# Altium footprint library ESKDPcbLib.PcbLib: 608 footprints (part 5 of 38)
Each footprint in its own frame and in the unit in brackets; x right, y up, seen from the top. Pads: shape width x height; smd on the part's side, far side on the other; paste and mask are expansions set on the pad; w line width, h text height; cw(c..) or ccw(c..) is an arc to the next point about the centre after c.
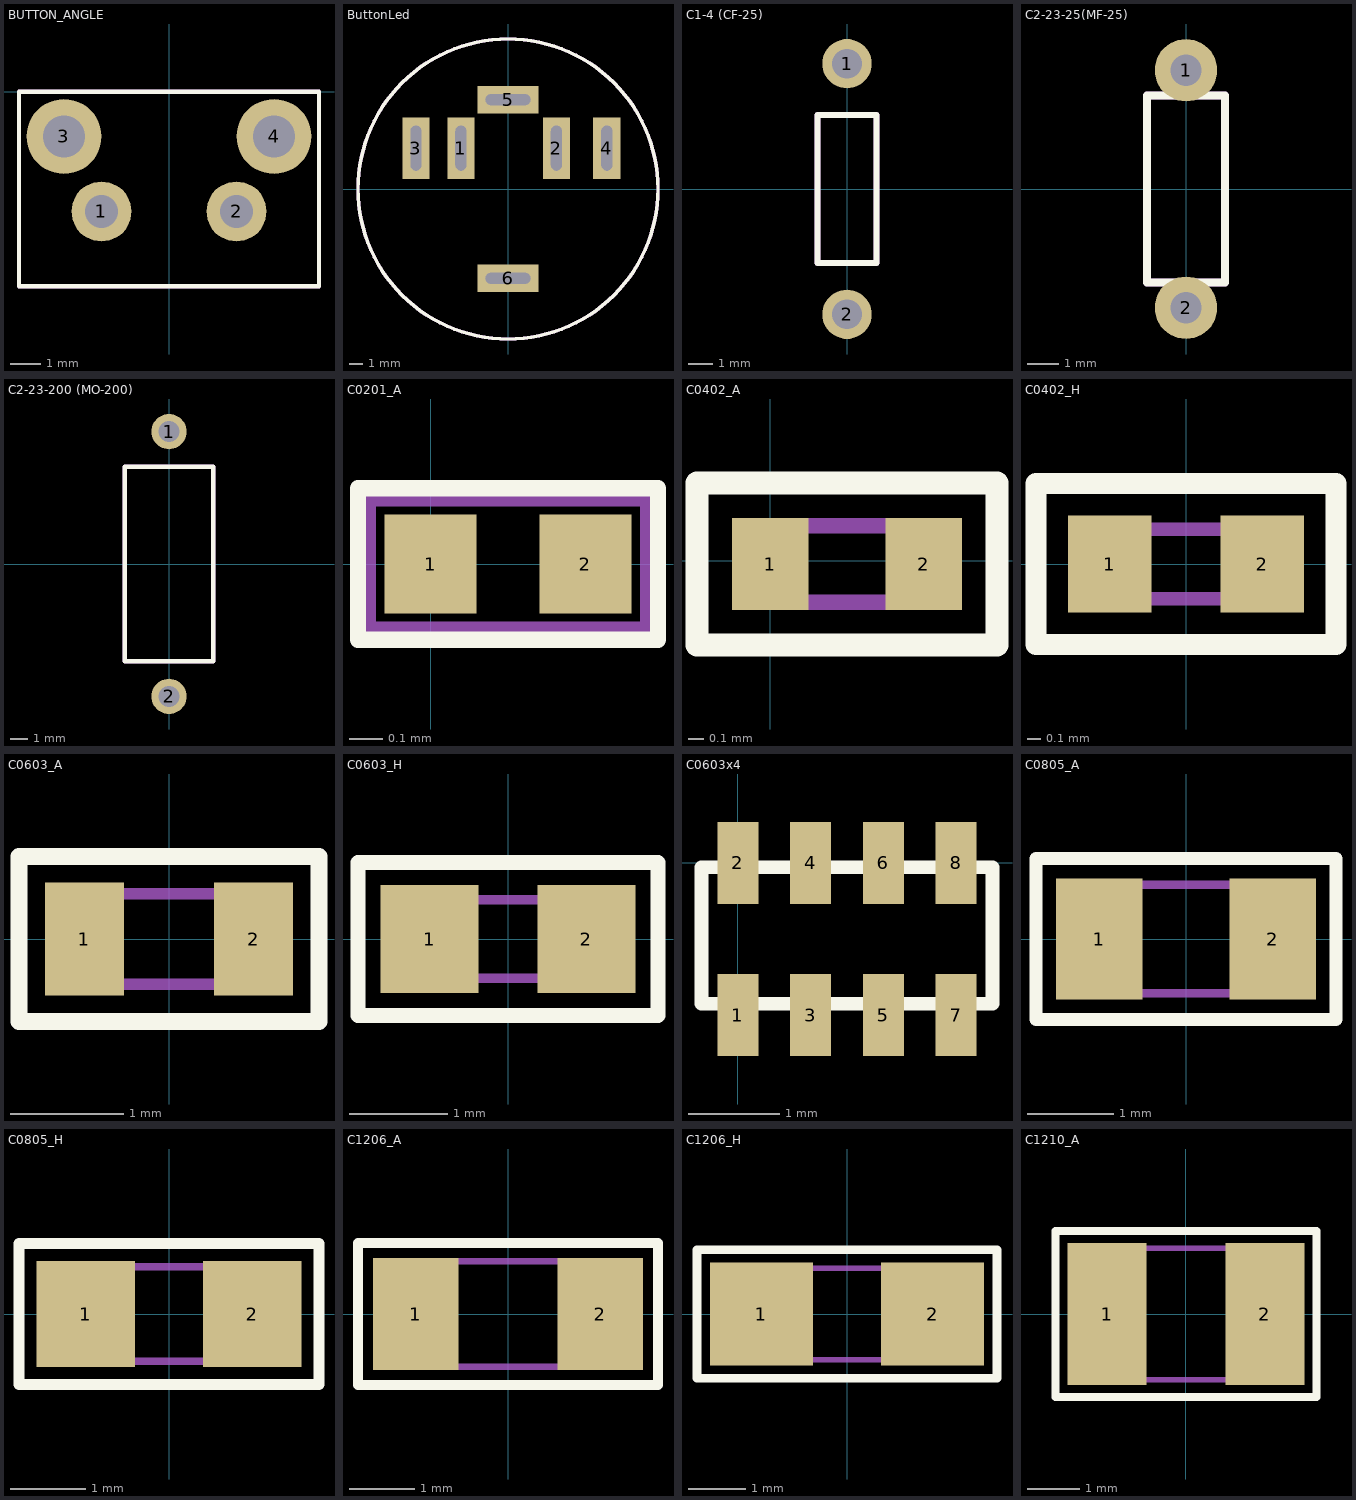
[diagram p4: the footprints below, top view; thin cyan lines are the x and y axes]

## BUTTON_ANGLE [mm]
pads (4):
  round 2 hole 1.1: 1(-2.25,-4) 2(2.25,-4)
  round 2.5 hole 1.4: 3(-3.5,-1.5) 4(3.5,-1.5)
Top Overlay:
  lines w0.15: -5,-6.5 5,-6.5 5,0 -5,0 -5,-6.5
Mechanical 7:
  lines w0.15: -5,-6.5 -5,0 5,0 5,-6.5 -5,-6.5
3D body: height 7.1, standoff -3.5, extent -3.998,-12.35 4,-0.05

## ButtonLed [mm]
pads (6):
  rect 2x4.5 hole 0.8 slot 3.3 at 90 deg: 1(-3.45,3) 2(3.55,3) 3(-6.75,3) 4(7.25,3)
  rect 4.5x2 hole 0.8 slot 3.3 at 0 deg: 5(0,6.55) 6(0,-6.55)
Top Overlay:
  circle w0.254: c0,0 r11
Mechanical 7:
  circle w0.254: c0,0 r11
Mechanical 10:
  text ".Designator" at -1,13.75 h1.52
  text ".Comment" at -1,12 h1.52

## C1-4 (CF-25) [mm]
pads (2):
  round 2 hole 1.2: 1(0,5.08) 2(0,-5.08)
Top Overlay:
  lines w0.254: -1.2,-3 1.2,-3 1.2,3 -1.2,3 -1.2,-3
Mechanical 7:
  lines w0.254: -1.2,-3 1.2,-3 1.2,3 -1.2,3 -1.2,-3
Mechanical 10:
  text ".Designator" at 4.2,3.3 h2
  text ".Comment" at 4.2,1.7 h2
3D body "Res40-Axial Short 0_25W-820K.step": height 2.41, standoff -2, extent -1.2,-5.38 1.2,5.38

## C2-23-25(MF-25) [mm]
pads (2):
  round 2 hole 1: 1(0,3.81) 2(0,-3.81)
Top Overlay:
  lines w0.254: -1.25,-3 1.25,-3 1.25,3 -1.25,3 -1.25,-3
Mechanical 7:
  lines w0.254: -1.25,-3 1.25,-3 1.25,3 -1.25,3 -1.25,-3
Mechanical 10:
  text ".Designator" at 4.2,3.3 h2
  text ".Comment" at 4.2,1.7 h2
3D body "MFR-25 MFR50S (300mils).STEP": height 3.2, standoff -2.08, extent -1.2,-4.085 1.2,4.085

## C2-23-200 (MO-200) [mm]
pads (2):
  round 2 hole 1.2: 1(0,7.5) 2(0,-7.5)
Top Overlay:
  lines w0.254: -2.5,-5.5 -2.5,5.5 2.5,5.5 2.5,-5.5 -2.5,-5.5
Mechanical 7:
  lines w0.254: -2.5,-5.5 -2.5,5.5 2.5,5.5 2.5,-5.5 -2.5,-5.5
Mechanical 10:
  text ".Comment" at 4.2,1.7 h2
  text ".Designator" at 4.2,3.3 h2
3D body "C2-23-15mm.STEP": height 4.7, standoff -2.5, extent -2.1,-7.8 2.1,7.8

## C0201_A [mm]
pads (2):
  rect 0.28x0.3 smd mask+0.05: 1(0,0) 2(0.47,0)
Top Overlay:
  lines w0.05: -0.22,-0.23 0.69,-0.23 0.69,0.23 -0.22,0.23 -0.22,-0.23
Mechanical 7:
  lines w0.05: -0.19,-0.2 -0.19,0.2 0.66,0.2 0.66,-0.2 -0.19,-0.2
Mechanical 10:
  text ".Designator" at -0.08,0.73 h0.8
  text ".Comment" at -0.08,-1.13 h0.6
3D body "С0201.step": height 0.3, standoff 0, extent -0.075,-0.15 0.525,0.15

## C0402_A [mm]
pads (2):
  rect 0.5x0.6 smd: 1(0,-0.02) 2(1,-0.02)
Top Overlay:
  lines w0.15: -0.48,-0.55 1.48,-0.55 1.48,0.51 -0.48,0.51 -0.48,-0.55
Mechanical 7:
  lines w0.1: 0,-0.27 0,0.23 1,0.23 1,-0.27 0,-0.27
Mechanical 10:
  text ".Comment" at -0.08,-1.13 h0.6
  text ".Designator" at -0.08,0.73 h0.8
3D body "С0402.step": height 0.45, standoff -0.05, extent 0,-0.25 1,0.25

## C0402_H [mm]
height 0.55
pads (2):
  rect 0.6x0.7 smd: 1(-0.55,0) 2(0.55,0)
Top Overlay:
  lines w0.15: -1.08,-0.58 1.08,-0.58 1.08,0.58 -1.08,0.58 -1.08,-0.58
Mechanical 7:
  lines w0.1: -0.5,-0.25 -0.5,0.25 0.5,0.25 0.5,-0.25 -0.5,-0.25
Mechanical 10:
  text ".Designator" at -0.58,0.75 h0.8
  text ".Comment" at -0.6,-1.12 h0.6
3D body: height 0.55, standoff 0, extent -0.5,-0.25 0.5,0.25

## C0603_A [mm]
height 0.9
pads (2):
  rect 0.7x1 smd: 1(-0.75,0) 2(0.75,0)
Top Overlay:
  lines w0.15: -1.33,-0.73 -1.33,0.73 1.33,0.73 1.33,-0.73 -1.33,-0.73
Mechanical 7:
  lines w0.1: -0.8,-0.4 0.8,-0.4 0.8,0.4 -0.8,0.4 -0.8,-0.4
Mechanical 10:
  text ".Comment" at -0.75,-1.28 h0.6
  text ".Designator" at -0.62,1 h0.8
3D body "С0603.step": height 0.8, standoff 0, extent -0.8,-0.4 0.8,0.4

## C0603_H [mm]
height 0.9
pads (2):
  rect 1x1.1 smd: 1(-0.8,0) 2(0.8,0)
Top Overlay:
  lines w0.15: -1.53,-0.78 -1.53,0.78 1.53,0.78 1.53,-0.78 -1.53,-0.78
Mechanical 7:
  lines w0.1: -0.8,-0.4 0.8,-0.4 0.8,0.4 -0.8,0.4 -0.8,-0.4
Mechanical 10:
  text ".Designator" at -0.62,1 h0.8
  text ".Comment" at -0.61,-1.33 h0.6
3D body: height 0.9, standoff 0, extent -0.8,-0.4 0.8,0.4

## C0603x4 [mm]
height 0.55
pads (8):
  rect 0.45x0.9 smd: 1(0,-1.675) 2(0,0) 3(0.8,-1.675) 4(0.8,0) 5(1.6,-1.675) 6(1.6,0) 7(2.4,-1.675) 8(2.4,0)
Top Overlay:
  lines w0.15: -0.4,-1.55 2.8,-1.55 2.8,-0.05 -0.4,-0.05 -0.4,-1.55
Mechanical 7:
  lines w0.1: -0.4,-1.55 -0.4,-0.05 2.8,-0.05 2.8,-1.55 -0.4,-1.55
Mechanical 10:
  text ".Comment" at -0.56,-1.1 h0.6
  text ".Designator" at -0.58,0.75 h0.8
3D body: height 0.55, standoff 0, extent -0.4,-1.55 2.8,-0.05

## C0805_A [mm]
height 1.3
pads (2):
  rect 1x1.4 smd: 1(-1,0) 2(1,0)
Top Overlay:
  lines w0.15: -1.73,-0.93 1.73,-0.93 1.73,0.93 -1.73,0.93 -1.73,-0.93
Mechanical 7:
  lines w0.1: -1,-0.625 -1,0.625 1,0.625 1,-0.625 -1,-0.625
Mechanical 10:
  text ".Comment" at -0.59,-1.6 h0.6
  text ".Designator" at -0.46,1.29 h0.8
3D body "С0805.step": height 0.6, standoff 0, extent -1,-0.625 1,0.625

## C0805_H [mm]
height 1.3
pads (2):
  rect 1.3x1.4 smd: 1(-1.1,0) 2(1.1,0)
Top Overlay:
  lines w0.15: -1.98,-0.93 -1.98,0.93 1.98,0.93 1.98,-0.93 -1.98,-0.93
Mechanical 7:
  lines w0.1: -1,-0.625 1,-0.625 1,0.625 -1,0.625 -1,-0.625
Mechanical 10:
  text ".Designator" at -0.47,1.37 h0.8
  text ".Comment" at -0.45,-1.62 h0.6
3D body: height 1.3, standoff 0, extent -1,-0.625 1,0.625

## C1206_A [mm]
height 1.5
pads (2):
  rect 1.3x1.7 smd: 1(-1.4,0) 2(1.4,0)
Top Overlay:
  lines w0.15: -2.28,-1.08 -2.28,1.08 2.28,1.08 2.28,-1.08 -2.28,-1.08
Mechanical 7:
  lines w0.1: -1.6,-0.8 1.6,-0.8 1.6,0.8 -1.6,0.8 -1.6,-0.8
Mechanical 10:
  text ".Comment" at -0.71,-1.67 h0.6
  text ".Designator" at -0.55,1.31 h0.8
3D body "С1206.step": height 0.89, standoff 0.11, extent -1.6,-0.8 1.6,0.8

## C1206_H [mm]
height 1.5
pads (2):
  rect 1.8x1.8 smd: 1(-1.5,0) 2(1.5,0)
Top Overlay:
  lines w0.15: -2.63,-1.13 -2.63,1.13 2.63,1.13 2.63,-1.13 -2.63,-1.13
Mechanical 7:
  lines w0.1: -1.6,-0.8 1.6,-0.8 1.6,0.8 -1.6,0.8 -1.6,-0.8
Mechanical 10:
  text ".Designator" at -0.55,1.31 h0.8
  text ".Comment" at -0.57,-1.8 h0.6
3D body: height 1.5, standoff 0, extent -1.6,-0.8 1.6,0.8

## C1210_A [mm]
height 2.5
pads (2):
  rect 1.5x2.7 smd: 1(-1.5,0) 2(1.5,0)
Top Overlay:
  lines w0.15: -2.48,-1.58 2.48,-1.58 2.48,1.58 -2.48,1.58 -2.48,-1.58
Mechanical 7:
  lines w0.1: -1.6,-1.25 -1.6,1.25 1.6,1.25 1.6,-1.25 -1.6,-1.25
Mechanical 10:
  text ".Comment" at -0.74,-2.23 h0.6
  text ".Designator" at -0.71,1.89 h0.8
3D body "С1210.step": height 0.89, standoff 0.11, extent -1.6,-1.25 1.6,1.25